# Altium footprint library Mainboard.PcbLib: 37 footprints (part 3 of 3)
Each footprint in its own frame and in the unit in brackets; x right, y up, seen from the top. Pads: shape width x height; smd on the part's side, far side on the other; paste and mask are expansions set on the pad; w line width, h text height; cw(c..) or ccw(c..) is an arc to the next point about the centre after c.
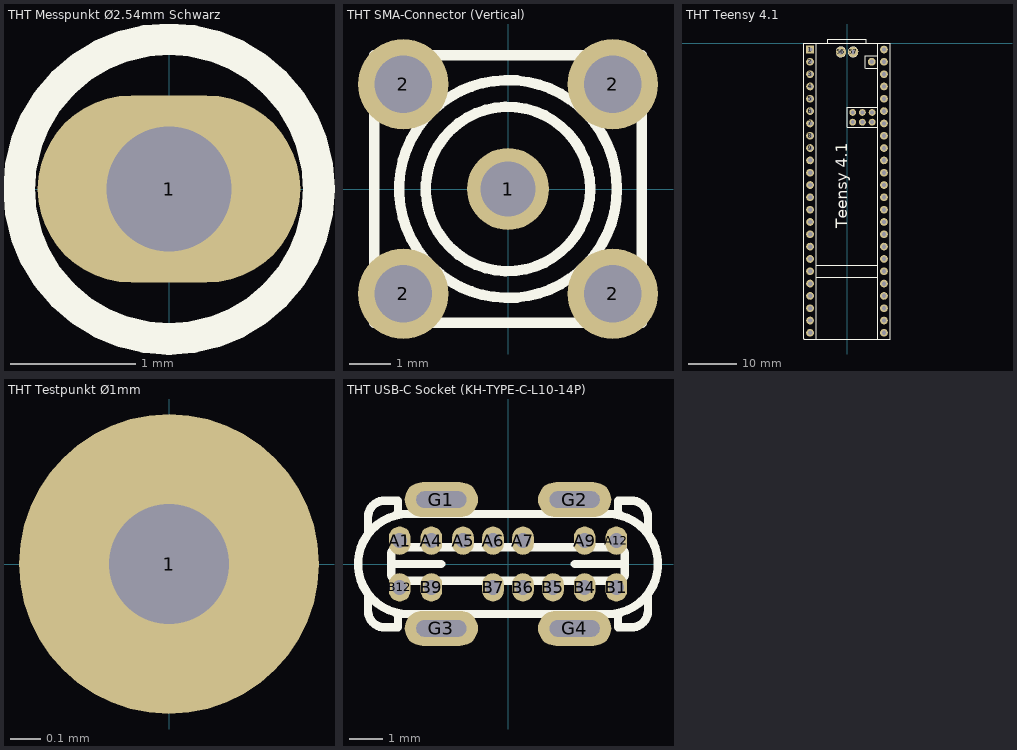
[diagram p2: the footprints below, top view; thin cyan lines are the x and y axes]

## THT Messpunkt Ø2.54mm Schwarz [mm]
pads (1):
  oval 2.1x1.5 hole 1: 1(0,0)
Top Overlay:
  circle w0.254: c0,0 r1.2
3D body "User Library-Test Point Keystone - 5001 BLACK.STEP": height 4.57, standoff -3.05, extent -1.27,-1.27 1.27,1.27

## THT SMA-Connector (Vertical) [mm]
height 6
pads (5):
  round 2 hole 1.35: 1(0,0)
  round 2.2 hole 1.4: 2(-2.55,-2.55) 2(-2.55,2.55) 2(2.55,-2.55) 2(2.55,2.55)
Top Overlay:
  circle w0.254: c0,0 r2
  circle w0.254: c0,0 r2.65
  circle w0.254: c0,0 r0.6
  lines w0.254: -3.25,-3.25 0,-3.25 3.25,-3.25 3.25,0 3.25,3.25 0,3.25 -3.25,3.25 -3.25,0 -3.25,-3.25 ; -3.05,-3.05 -2.55,-3.05 -2.05,-3.05 -2.05,-2.55 -2.05,-2.05 -2.55,-2.05 -3.05,-2.05 -3.05,-2.55 -3.05,-3.05 ; -3.05,2.05 -2.55,2.05 -2.05,2.05 -2.05,2.55 -2.05,3.05 -2.55,3.05 -3.05,3.05 -3.05,2.55 -3.05,2.05 ; 2.05,-3.05 2.55,-3.05 3.05,-3.05 3.05,-2.55 3.05,-2.05 2.55,-2.05 2.05,-2.05 2.05,-2.55 2.05,-3.05 ; 2.05,2.05 2.55,2.05 3.05,2.05 3.05,2.55 3.05,3.05 2.55,3.05 2.05,3.05 2.05,2.55 2.05,2.05
3D body "Molex - 73391-0060.x_t": height 9.85, standoff -3.75, extent -3.25,-3.25 3.25,3.25

## THT Teensy 4.1 [mm]
pads (57):
  rect 1.6x1.6 hole 0.9: 1(-7.62,-1.27)
  round 1.6 hole 0.9: 2(-7.62,-3.81) 3(-7.62,-6.35) 4(-7.62,-8.89) 5(-7.62,-11.43) 6(-7.62,-13.97) 7(-7.62,-16.51) 8(-7.62,-19.05) 9(-7.62,-21.59) 10(-7.62,-24.13) 11(-7.62,-26.67) 12(-7.62,-29.21) 13(-7.62,-31.75) 14(-7.62,-34.29) 15(-7.62,-36.83) 16(-7.62,-39.37) 17(-7.62,-41.91) 18(-7.62,-44.45) 19(-7.62,-46.99) 20(-7.62,-49.53) 21(-7.62,-52.07) 22(-7.62,-54.61) 23(-7.62,-57.15) 24(-7.62,-59.69) 25(7.62,-59.69) 26(7.62,-57.15) 27(7.62,-54.61) 28(7.62,-52.07) 29(7.62,-49.53) 30(7.62,-46.99) 31(7.62,-44.45) 32(7.62,-41.91) 33(7.62,-39.37) 34(7.62,-36.83) 35(7.62,-34.29) 36(7.62,-31.75) 37(7.62,-29.21) 38(7.62,-26.67) 39(7.62,-24.13) 40(7.62,-21.59) 41(7.62,-19.05) 42(7.62,-16.51) 43(7.62,-13.97) 44(7.62,-11.43) 45(7.62,-8.89) 46(7.62,-6.35) 47(7.62,-3.81) 48(7.62,-1.27) 49(5.08,-3.81)
  round 1.4 hole 0.8: 50(1.17,-16.24) 51(1.17,-14.24) 52(3.17,-16.24) 53(3.17,-14.24) 54(5.17,-16.24) 55(5.17,-14.24)
  round 2.1 hole 1: 56(-1.27,-1.78) 57(1.27,-1.78)
Top Overlay:
  circle w0.254: c1.27,-1.78 r1
  circle w0.254: c-1.27,-1.78 r1
  lines w0.254: -6.34,-60.95 -6.34,-35.575 -6.34,0 ; -6.34,-48.27 6.34,-48.27 ; -6.34,-45.71 6.34,-45.71 ; -4,0 -4,0.9 -0.2,0.9 4,0.9 4,0 ; 3.8,-5.09 3.8,-2.55 ; 3.8,-2.53 6.34,-2.53 ; 3.82,-5.09 6.325,-5.09 ; 6.34,-60.95 6.34,-35.575 6.34,0 ; 6.34,-17.32 3.17,-17.32 0,-17.32 0,-13.16 3.17,-13.16 6.34,-13.16 ; 8.89,-35.575 8.89,0 -8.9,0 -8.9,-35.575 -8.9,-60.95 -8.89,-60.96 8.89,-60.96 8.89,-35.56
  text "Teensy 4.1" at 0.888,-38.08 h4
3D body "CUI_DEVICES_HSB03-141406.x_t": height 19.7, standoff 13.7, extent -7,-36 7,-22
3D body "User Library-ZL262-4SG.step": height 8.4, standoff -3.15, extent 6.37,-60.96 8.87,-50.8
3D body "User Library-ZL262-4SG.step": height 8.4, standoff -3.15, extent 6.37,-50.8 8.87,-40.64
3D body "User Library-ZL262-4SG.step": height 8.4, standoff -3.15, extent 6.37,-40.64 8.87,-30.48
3D body "User Library-ZL262-4SG.step": height 8.4, standoff -3.15, extent 6.37,-30.48 8.87,-20.32
3D body "User Library-ZL262-4SG.step": height 8.4, standoff -3.15, extent 6.37,-20.32 8.87,-10.16
3D body "User Library-ZL262-4SG.step": height 8.4, standoff -3.15, extent 6.37,-10.16 8.87,0
3D body "User Library-Header_Male_4Pin.STEP": height 13.7, standoff 2.16, extent 6.375,-10.16 8.865,0
3D body "User Library-Header_Male_4Pin.STEP": height 13.7, standoff 2.16, extent 6.375,-20.32 8.865,-10.16
3D body "User Library-Header_Male_4Pin.STEP": height 13.7, standoff 2.16, extent 6.375,-40.64 8.865,-30.48
3D body "User Library-Header_Male_4Pin.STEP": height 13.7, standoff 2.16, extent 6.375,-50.8 8.865,-40.64
3D body "User Library-Header_Male_4Pin.STEP": height 13.7, standoff 2.16, extent 6.375,-60.96 8.865,-50.8
3D body "User Library-Header_Male_4Pin.STEP": height 13.7, standoff 2.16, extent -8.865,-60.96 -6.375,-50.8
3D body "User Library-Header_Male_4Pin.STEP": height 13.7, standoff 2.16, extent -8.865,-50.8 -6.375,-40.64
3D body "User Library-Header_Male_4Pin.STEP": height 13.7, standoff 2.16, extent -8.865,-40.64 -6.375,-30.48
3D body "User Library-Header_Male_4Pin.STEP": height 13.7, standoff 2.16, extent -8.865,-30.48 -6.375,-20.32
3D body "User Library-Header_Male_4Pin.STEP": height 13.7, standoff 2.16, extent -8.865,-20.32 -6.375,-10.16
3D body "User Library-Header_Male_4Pin.STEP": height 13.7, standoff 2.16, extent -8.865,-10.16 -6.375,0
3D body "User Library-ZL262-4SG.step": height 8.4, standoff -3.15, extent -8.87,-10.16 -6.37,0
3D body "User Library-ZL262-4SG.step": height 8.4, standoff -3.15, extent -8.87,-20.32 -6.37,-10.16
3D body "User Library-ZL262-4SG.step": height 8.4, standoff -3.15, extent -8.87,-30.48 -6.37,-20.32
3D body "User Library-ZL262-4SG.step": height 8.4, standoff -3.15, extent -8.87,-40.64 -6.37,-30.48
3D body "User Library-ZL262-4SG.step": height 8.4, standoff -3.15, extent -8.87,-50.8 -6.37,-40.64
3D body "User Library-ZL262-4SG.step": height 8.4, standoff -3.15, extent -8.87,-60.96 -6.37,-50.8
3D body "User Library-Header_Male_4Pin.STEP": height 13.7, standoff 2.16, extent 6.375,-30.48 8.865,-20.32
3D body "Teensy 4.1.x_b": height 14.97, standoff 9.71, extent -8.89,-60.96 8.89,0.926
3D body "Pogo-Pin.STEP": height 10.85, standoff -4.25, extent 0.52,-2.53 2.02,-1.03
3D body "Pogo-Pin.STEP": height 10.85, standoff -4.25, extent -2.02,-2.53 -0.52,-1.03
3D body "ESQT-103-02-L-D-410.x_t": height 8.55, standoff -2.24, extent 0.021,-17.24 6.319,-13.24
3D body "pin header 1x3 pitch 2mm heigth 5mm.stp": height 13.29, standoff 4.59, extent 0.17,-15.24 6.17,-13.24
3D body "pin header 1x3 pitch 2mm heigth 5mm.stp": height 13.29, standoff 4.59, extent 0.17,-17.24 6.17,-15.24

## THT Testpunkt Ø1mm [mm]
pads (1):
  round 1 hole 0.4: 1(0,0)

## THT USB-C Socket (KH-TYPE-C-L10-14P) [mm]
pads (18):
  oval 0.65x0.85 hole 0.45: A1(-3.25,0.7) A4(-2.3,0.7) A5(-1.35,0.7) A6(-0.45,0.7) A7(0.45,0.7) A9(2.3,0.7) A12(3.25,0.7) B1(3.25,-0.7) B4(2.3,-0.7) B5(1.35,-0.7) B6(0.45,-0.7) B7(-0.45,-0.7) B9(-2.3,-0.7) B12(-3.25,-0.7)
  oval 2.2x1.05 hole 0.5 slot 1.5 at 0 deg: G1(-2,1.93) G2(2,1.93) G3(-2,-1.93) G4(2,-1.93)
Top Overlay:
  lines w0.254: -4.2,-0.9 -4.2,-1.4 ccw(c-3.7,-1.4) -3.7,-1.9 -3.3,-1.9 -3.3,-1.5 ; -4.2,0.9 -4.2,1.4 cw(c-3.7,1.4) -3.7,1.9 -3.3,1.9 -3.3,1.5 ; -2.7,-1.5 -2.7,-2.1 -1.3,-2.1 -1.3,-1.5 ; -2.7,1.5 -2.7,2.1 -1.3,2.1 -1.3,1.5 ; -2,0 -3.5,0 ; 1.3,-1.5 1.3,-2.1 2.7,-2.1 2.7,-1.5 ; 1.3,1.5 1.3,2.1 2.7,2.1 2.7,1.5 ; 2,0 3.5,0 ; 3.3,-1.5 3.3,-1.9 3.7,-1.9 ccw(c3.7,-1.4) 4.2,-1.4 4.2,-0.9 ; 3.3,1.5 3.3,1.9 3.7,1.9 cw(c3.7,1.4) 4.2,1.4 4.2,0.9 ; -3.5,0 -3.5,0.3 cw(c-3.3,0.3) -3.3,0.5 0,0.5 3.3,0.5 cw(c3.3,0.3) 3.5,0.3 3.5,0 ; -3.5,0 -3.5,-0.3 ccw(c-3.3,-0.3) -3.3,-0.5 0,-0.5 3.3,-0.5 ccw(c3.3,-0.3) 3.5,-0.3 3.5,0 ; -3,-1.5 cw(c-3,0) -3,1.5 3,1.5 cw(c3,0) 3,-1.5 -3,-1.5
3D body "KH-TYPE-C-L10-14P.x_t": height 10, standoff -2, extent -4.47,-2.08 4.47,2.08